# Altium footprint library main.PcbLib: 217 footprints (part 6 of 14)
Each footprint in its own frame and in the unit in brackets; x right, y up, seen from the top. Pads: shape width x height; smd on the part's side, far side on the other; paste and mask are expansions set on the pad; w line width, h text height; cw(c..) or ccw(c..) is an arc to the next point about the centre after c.
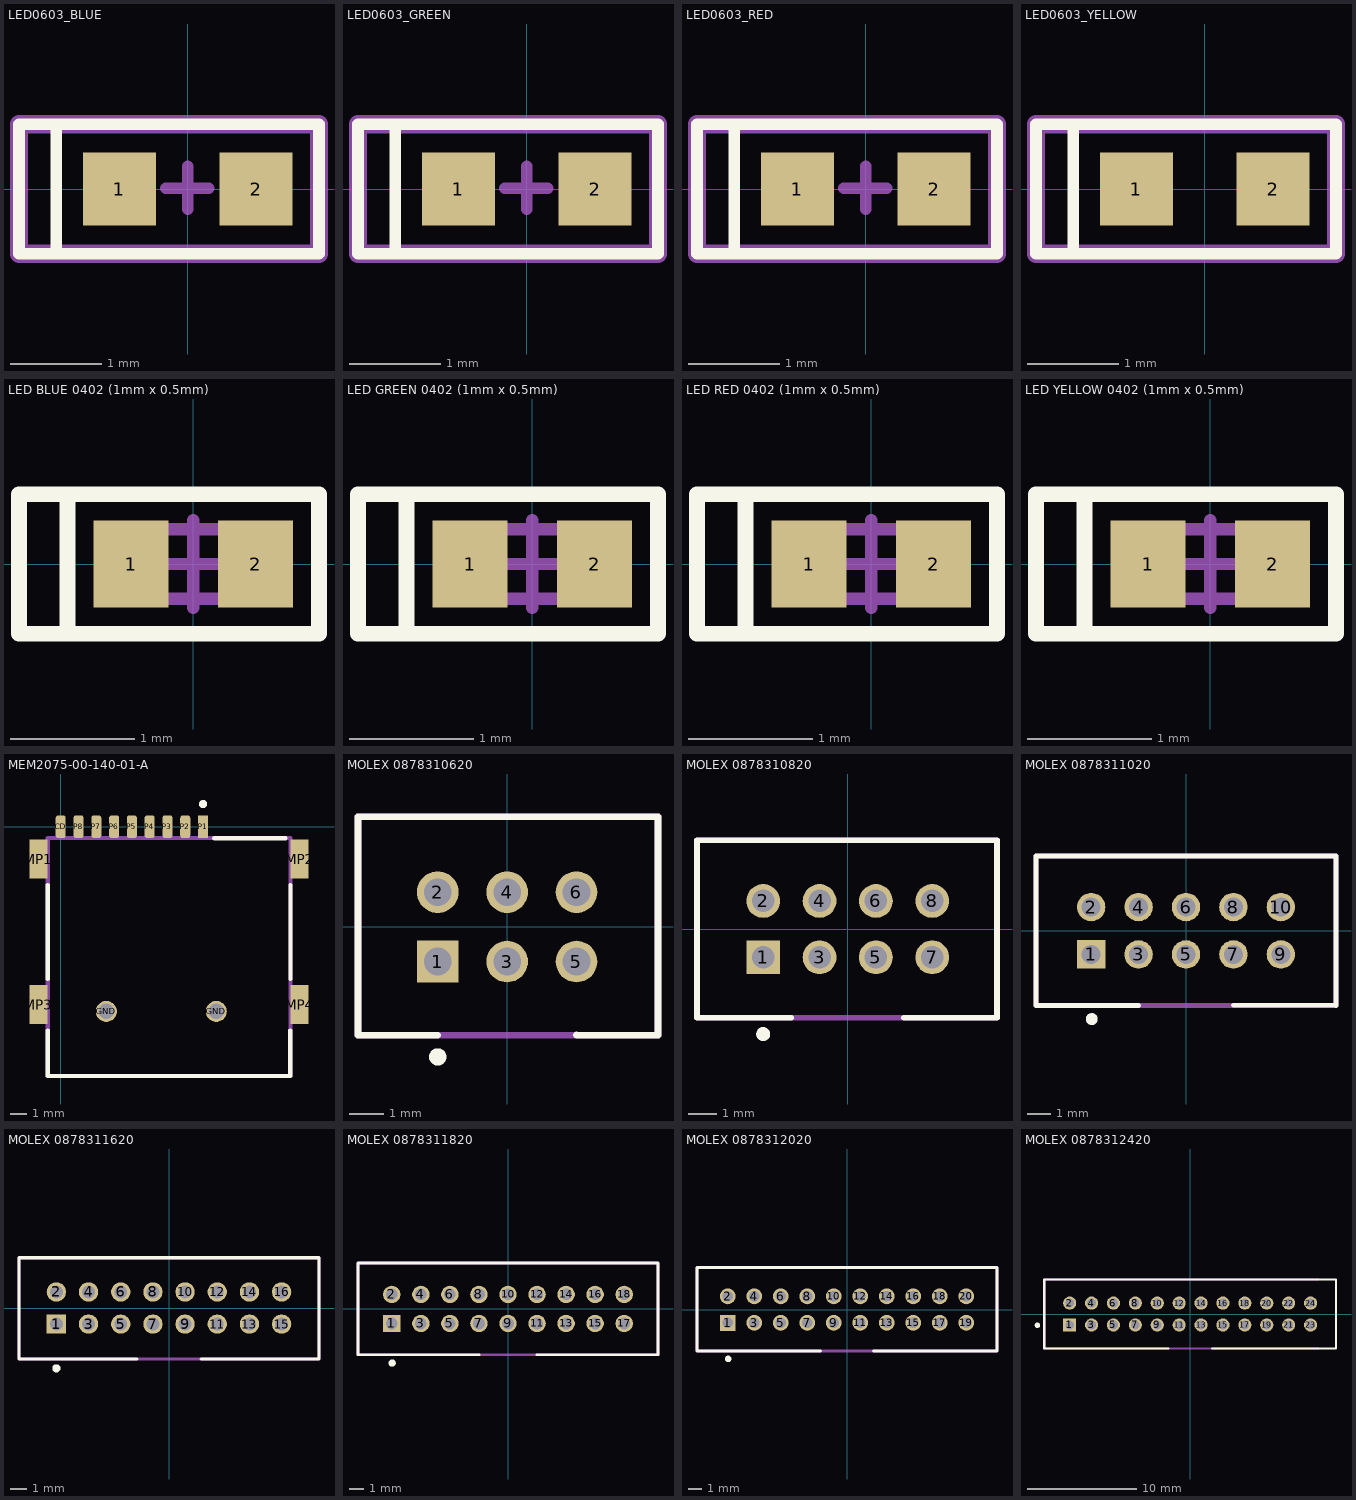
[diagram p5: the footprints below, top view; thin cyan lines are the x and y axes]

## LED0603_BLUE [mm] "LED0603_BLUE"
height 0.65
pads (2):
  rect 0.8x0.8 smd: 1(-0.75,0) 2(0.75,0)
Top Overlay:
  lines w0.127: -1.44,-0.7 -1.44,0.7 ; -1.85,-0.71 -1.85,0.71 1.44,0.71 1.44,-0.71 -1.85,-0.71
Mechanical 7:
  text ".Designator" at -1.424,-0.258 h0.76
Mechanical 15:
  lines w0.127: -0.24,0.01 0.23,0.01 ; 0,-0.22 0,0.25
  lines w0.2: -1.85,-0.71 1.44,-0.71 1.44,0.71 -1.85,0.71 -1.85,-0.71
3D body "sml-310vtt86.stp": height 0.8, standoff 0, extent -0.8,-0.4 0.8,0.4

## LED0603_GREEN [mm] "LED0603_GREEN"
height 0.65
pads (2):
  rect 0.8x0.8 smd: 1(-0.75,0) 2(0.75,0)
Top Overlay:
  lines w0.127: -1.44,-0.7 -1.44,0.7 ; -1.85,-0.71 1.44,-0.71 1.44,0.71 -1.85,0.71 -1.85,-0.71
Mechanical 7:
  text ".Designator" at -1.424,-0.258 h0.76
Mechanical 15:
  lines w0.127: -0.24,0.01 0.23,0.01 ; 0,-0.22 0,0.25
  lines w0.2: -1.85,-0.71 -1.85,0.71 1.44,0.71 1.44,-0.71 -1.85,-0.71
3D body "User Library-LED_0603_G.STEP": height 0.6, standoff 0, extent -0.8,-0.4 0.8,0.4

## LED0603_RED [mm] "LED0603_RED"
height 0.65
pads (2):
  rect 0.8x0.8 smd: 1(-0.75,0) 2(0.75,0)
Top Overlay:
  lines w0.127: -1.44,-0.7 -1.44,0.7 ; -1.85,-0.71 1.44,-0.71 1.44,0.71 -1.85,0.71 -1.85,-0.71
Mechanical 7:
  text ".Designator" at -1.424,-0.258 h0.76
Mechanical 15:
  lines w0.127: -0.24,0.01 0.23,0.01 ; 0,-0.22 0,0.25
  lines w0.2: -1.85,-0.71 -1.85,0.71 1.44,0.71 1.44,-0.71 -1.85,-0.71
3D body "User Library-LED_0603_R.STEP": height 0.6, standoff 0, extent -0.8,-0.4 0.8,0.4

## LED0603_YELLOW [mm] "LED0603_YELLOW"
height 0.65
pads (2):
  rect 0.8x0.8 smd: 1(-0.75,0) 2(0.75,0)
Top Overlay:
  lines w0.127: -1.44,-0.7 -1.44,0.7 ; -1.85,-0.71 -1.85,0.71 1.44,0.71 1.44,-0.71 -1.85,-0.71
Mechanical 7:
  text ".Designator" at -1.424,-0.258 h0.76
Mechanical 15:
  lines w0.2: -1.85,-0.71 1.44,-0.71 1.44,0.71 -1.85,0.71 -1.85,-0.71
3D body "ALSRobot-LED0603(Y).STEP": height 0.6, standoff 0, extent -0.81,-0.4 0.81,0.4

## LED BLUE 0402 (1mm x 0.5mm) [mm] "LED BLUE 0402 (1mm x 0.5mm)"
height 0.4
pads (2):
  rect 0.6x0.7 smd: 1(-0.5,0) 2(0.5,0)
Top Overlay:
  lines w0.127: -1.01,-0.56 -1.01,0.56 ; -1.4,-0.56 -1.4,0.56 1.01,0.56 1.01,-0.56 -1.4,-0.56
Mechanical 7:
  text ".Designator" at -0.66,-0.28 h0.76
Mechanical 13:
  lines w0.1: -0.53,-0.28 -0.53,0.28 0.53,0.28 0.53,-0.28 -0.53,-0.28
Mechanical 15:
  lines w0.05: -1.01,-0.56 -1.01,0.56 1.01,0.56 1.01,-0.56 -1.01,-0.56
  lines w0.1: -0.35,0 0.35,0 ; 0,-0.35 0,0.35
3D body "User Library-LED_1006_B.STEP": height 0.2, standoff 0, extent -0.5,-0.3 0.5,0.3

## LED GREEN 0402 (1mm x 0.5mm) [mm] "LED GREEN 0402 (1mm x 0.5mm)"
height 0.4
pads (2):
  rect 0.6x0.7 smd: 1(-0.5,0) 2(0.5,0)
Top Overlay:
  lines w0.127: -1.01,-0.56 -1.01,0.56 ; -1.4,-0.56 1.01,-0.56 1.01,0.56 -1.4,0.56 -1.4,-0.56
Mechanical 7:
  text ".Designator" at -0.66,-0.28 h0.76
Mechanical 13:
  lines w0.1: -0.53,-0.28 0.53,-0.28 0.53,0.28 -0.53,0.28 -0.53,-0.28
Mechanical 15:
  lines w0.05: -1.01,-0.56 1.01,-0.56 1.01,0.56 -1.01,0.56 -1.01,-0.56
  lines w0.1: -0.35,0 0.35,0 ; 0,-0.35 0,0.35
3D body "User Library-LED_1006_G.STEP": height 0.2, standoff 0, extent -0.5,-0.3 0.5,0.3

## LED RED 0402 (1mm x 0.5mm) [mm] "LED RED 0402 (1mm x 0.5mm)"
height 0.4
pads (2):
  rect 0.6x0.7 smd: 1(-0.5,0) 2(0.5,0)
Top Overlay:
  lines w0.127: -1.01,-0.56 -1.01,0.56 ; -1.4,-0.56 -1.4,0.56 1.01,0.56 1.01,-0.56 -1.4,-0.56
Mechanical 7:
  text ".Designator" at -0.66,-0.28 h0.76
Mechanical 13:
  lines w0.1: -0.53,-0.28 -0.53,0.28 0.53,0.28 0.53,-0.28 -0.53,-0.28
Mechanical 15:
  lines w0.05: -1.01,-0.56 -1.01,0.56 1.01,0.56 1.01,-0.56 -1.01,-0.56
  lines w0.1: -0.35,0 0.35,0 ; 0,-0.35 0,0.35
3D body "User Library-LED_1006_R.STEP": height 0.2, standoff 0, extent -0.5,-0.3 0.5,0.3

## LED YELLOW 0402 (1mm x 0.5mm) [mm] "LED YELLOW 0402 (1mm x 0.5mm)"
height 0.4
pads (2):
  rect 0.6x0.7 smd: 1(-0.5,0) 2(0.5,0)
Top Overlay:
  lines w0.127: -1.01,-0.56 -1.01,0.56 ; -1.4,-0.56 1.01,-0.56 1.01,0.56 -1.4,0.56 -1.4,-0.56
Mechanical 7:
  text ".Designator" at -0.66,-0.28 h0.76
Mechanical 13:
  lines w0.1: -0.53,-0.28 0.53,-0.28 0.53,0.28 -0.53,0.28 -0.53,-0.28
Mechanical 15:
  lines w0.05: -1.01,-0.56 1.01,-0.56 1.01,0.56 -1.01,0.56 -1.01,-0.56
  lines w0.1: -0.35,0 0.35,0 ; 0,-0.35 0,0.35
3D body "User Library-LED_1006_Y.STEP": height 0.2, standoff 0, extent -0.5,-0.3 0.5,0.3

## MEM2075-00-140-01-A [mm] "MEM2075-00-140-01-A"
height 1.4
pads (15):
  rrect50% 0.62x1.4 smd: CD(0,0) P2(7.7,0) P3(6.6,0) P4(5.5,0) P5(4.4,0) P6(3.3,0) P7(2.2,0) P8(1.1,0)
  round 1.3 hole 0.95: GND(2.82,-11.42) GND(9.62,-11.42)
  rect 1.1x2.4 smd: MP1(-1.38,-2) MP2(14.77,-2) MP3(-1.38,-11) MP4(14.77,-11)
  rect 0.62x1.4 smd: P1(8.8,0)
Top Overlay:
  circle w0.25: c8.8,1.4 r0.125
  lines w0.254: -0.805,-12.61 -0.805,-15.41 14.195,-15.41 14.195,-12.61 ; -0.805,-9.41 -0.805,-3.61 ; 9.495,-0.71 13.895,-0.71 ; 14.2,-9.41 14.2,-3.61
Mechanical 7:
  text ".Designator" at 0.67,-5.935 h1.52
Mechanical 15:
  lines w0.254: -0.8,-15.41 14.2,-15.41 14.2,-0.7 -0.8,-0.7 -0.8,-15.41
3D body: height 1.4, standoff 0, extent -0.805,-15.41 14.195,-0.71

## MOLEX 0878310620 [mm] "MOLEX 0878310620"
height 5.4
pads (6):
  rect 1.2x1.2 hole 0.8 paste-1000 mask+0: 1(-2,-1)
  round 1.2 hole 0.8 paste-1000 mask+0: 2(-2,1) 3(0,-1) 4(0,1) 5(2,-1) 6(2,1)
Top Overlay:
  circle w0.25: c-2,-3.75 r0.125
  lines w0.2: -2,-3.125 -4.3,-3.125 -4.3,3.175 4.35,3.175 4.35,-3.126 1.999,-3.123
Mechanical 7:
  text ".Designator" at -3.94,-1.63 h1.52
Mechanical 13:
  lines w0.2: -4.3,-3.125 4.35,-3.125 4.35,3.175 -4.3,3.175 -4.3,-3.125
Mechanical 15:
  lines w0.2: -4.3,-3.125 4.35,-3.125 4.35,3.175 -4.3,3.175 -4.3,-3.125
3D body "878310620.stp": height 6.4, standoff -2.5, extent -4.3,-3.125 4.35,3.175

## MOLEX 0878310820 [mm] "MOLEX 0878310820"
height 5.4
pads (8):
  rect 1.2x1.2 hole 0.8 paste-1000 mask+0: 1(-3,-1)
  round 1.2 hole 0.8 paste-1000 mask+0: 2(-3,1) 3(-1,-1) 4(-1,1) 5(1,-1) 6(1,1) 7(3,-1) 8(3,1)
Top Overlay:
  circle w0.25: c-3,-3.725 r0.125
  lines w0.2: -2,-3.15 -5.35,-3.15 -5.35,3.15 5.3,3.15 5.3,-3.15 1.999,-3.147
Mechanical 7:
  text ".Designator" at -4.94,-1.63 h1.52
Mechanical 13:
  lines w0.2: 5.3,-3.15 -5.35,-3.15 -5.35,3.15 5.3,3.15 5.3,-2.2
Mechanical 15:
  lines w0.2: -5.35,-3.15 -5.35,3.15 5.3,3.15 5.3,-3.15 -5.35,-3.15
3D body "878310820.stp": height 6.4, standoff -2.5, extent -5.35,-3.15 5.3,3.15

## MOLEX 0878311020 [mm] "MOLEX 0878311020"
height 5.4
pads (10):
  rect 1.2x1.2 hole 0.8 paste-1000 mask+0: 1(-4,-1)
  round 1.2 hole 0.8 paste-1000 mask+0: 2(-4,1) 3(-2,-1) 4(-2,1) 5(0,-1) 6(0,1) 7(2,-1) 8(2,1) 9(4,-1) 10(4,1)
Top Overlay:
  circle w0.25: c-3.975,-3.725 r0.125
  lines w0.2: -2,-3.15 -6.325,-3.15 -6.325,3.15 6.325,3.15 6.325,-3.149 1.999,-3.146
Mechanical 7:
  text ".Designator" at -5.94,-1.63 h1.52
Mechanical 13:
  lines w0.2: 4.655,3.15 -6.325,3.15 -6.325,-3.15 6.325,-3.15 6.325,2.2
Mechanical 15:
  lines w0.2: -6.325,-3.15 -6.325,3.15 6.325,3.153 6.325,-3.15 -6.325,-3.15
3D body "878311020.stp": height 6.4, standoff -2.5, extent -6.325,-3.15 6.325,3.15

## MOLEX 0878311620 [mm] "MOLEX 0878311620"
height 5.4
pads (16):
  rect 1.2x1.2 hole 0.8 paste-1000 mask+0: 1(-7,-1)
  round 1.2 hole 0.8 paste-1000 mask+0: 2(-7,1) 3(-5,-1) 4(-5,1) 5(-3,-1) 6(-3,1) 7(-1,-1) 8(-1,1) 9(1,-1) 10(1,1) 11(3,-1) 12(3,1) 13(5,-1) 14(5,1) 15(7,-1) 16(7,1)
Top Overlay:
  circle w0.25: c-7,-3.75 r0.125
  lines w0.2: -2,-3.175 -9.325,-3.175 -9.325,3.125 9.325,3.125 9.325,-3.175 2,-3.175
Mechanical 7:
  text ".Designator" at -8.94,-1.63 h1.52
Mechanical 13:
  lines w0.2: 9.325,2.2 9.325,-3.175 -9.325,-3.175 -9.325,3.125 0.73,3.125 9.325,3.125
Mechanical 15:
  lines w0.2: -9.325,-3.175 9.325,-3.175 9.325,3.13 -9.325,3.125 -9.325,-3.175
3D body "878311620.stp": height 6.4, standoff -2.5, extent -9.325,-3.175 9.325,3.125

## MOLEX 0878311820 [mm] "MOLEX 0878311820"
height 5.4
pads (18):
  rect 1.2x1.2 hole 0.8 paste-1000 mask+0: 1(-8,-1)
  round 1.2 hole 0.8 paste-1000 mask+0: 2(-8,1) 3(-6,-1) 4(-6,1) 5(-4,-1) 6(-4,1) 7(-2,-1) 8(-2,1) 9(0,-1) 10(0,1) 11(2,-1) 12(2,1) 13(4,-1) 14(4,1) 15(6,-1) 16(6,1) 17(8,-1) 18(8,1)
Top Overlay:
  circle w0.25: c-7.975,-3.725 r0.125
  lines w0.2: -2,-3.15 -10.325,-3.15 -10.325,3.15 10.325,3.15 10.325,-3.15 2,-3.15
Mechanical 7:
  text ".Designator" at -9.94,-1.63 h1.52
Mechanical 13:
  lines w0.2: 0.655,3.15 -10.325,3.15 -10.325,-3.15 10.325,-3.15 10.325,2.2
Mechanical 15:
  lines w0.2: -10.325,-3.15 10.325,-3.15 10.325,3.156 -10.325,3.15 -10.325,-3.15
3D body "878311820.stp": height 6.4, standoff -2.5, extent -10.325,-3.15 10.325,3.15

## MOLEX 0878312020 [mm] "MOLEX 0878312020"
height 5.4
pads (20):
  rect 1.2x1.2 hole 0.8 paste-1000 mask+0: 1(-9,-1)
  round 1.2 hole 0.8 paste-1000 mask+0: 2(-9,1) 3(-7,-1) 4(-7,1) 5(-5,-1) 6(-5,1) 7(-3,-1) 8(-3,1) 9(-1,-1) 10(-1,1) 11(1,-1) 12(1,1) 13(3,-1) 14(3,1) 15(5,-1) 16(5,1) 17(7,-1) 18(7,1) 19(9,-1) 20(9,1)
Top Overlay:
  circle w0.25: c-8.975,-3.725 r0.125
  lines w0.2: -2,-3.125 -11.325,-3.125 -11.325,3.175 11.325,3.175 11.325,-3.125 2,-3.125
Mechanical 7:
  text ".Designator" at -10.94,-1.63 h1.52
Mechanical 13:
  lines w0.2: -0.345,3.175 -11.325,3.175 -11.325,-3.125 11.325,-3.125 11.325,2.2
Mechanical 15:
  lines w0.2: -11.325,-3.125 11.325,-3.125 11.325,3.182 -11.325,3.175 -11.325,-3.125
3D body "878312020.stp": height 6.4, standoff -2.5, extent -11.325,-3.125 11.325,3.175

## MOLEX 0878312420 [mm] "MOLEX 0878312420"
height 5.4
pads (24):
  rect 1.2x1.2 hole 0.8 paste-1000 mask+0: 1(-11,-1)
  round 1.2 hole 0.8 paste-1000 mask+0: 2(-11,1) 3(-9,-1) 4(-9,1) 5(-7,-1) 6(-7,1) 7(-5,-1) 8(-5,1) 9(-3,-1) 10(-3,1) 11(-1,-1) 12(-1,1) 13(1,-1) 14(1,1) 15(3,-1) 16(3,1) 17(5,-1) 18(5,1) 19(7,-1) 20(7,1) 21(9,-1) 22(9,1) 23(11,-1) 24(11,1)
Top Overlay:
  circle w0.25: c-13.95,-1.025 r0.125
  lines w0.2: -2,-3.15 -13.325,-3.15 -13.325,3.15 13.325,3.15 13.325,-3.15 2,-3.15
Mechanical 7:
  text ".Designator" at -12.94,-1.63 h1.52
Mechanical 13:
  lines w0.2: -2.345,3.15 -13.325,3.15 -13.325,-3.15 11.65,-3.15 ; 13.325,-2.275 13.325,2.125
Mechanical 15:
  lines w0.2: 11.65,-3.15 -13.325,-3.15 -13.325,3.15 11.65,3.157 ; 13.325,-2.225 13.325,2.183
3D body "878312420.stp": height 6.4, standoff -2.5, extent -13.325,-3.15 13.325,3.15